# Altium footprint library Cty1.PcbLib: 870 footprints (part 41 of 55)
Each footprint in its own frame and in the unit in brackets; x right, y up, seen from the top. Pads: shape width x height; smd on the part's side, far side on the other; paste and mask are expansions set on the pad; w line width, h text height; cw(c..) or ccw(c..) is an arc to the next point about the centre after c.
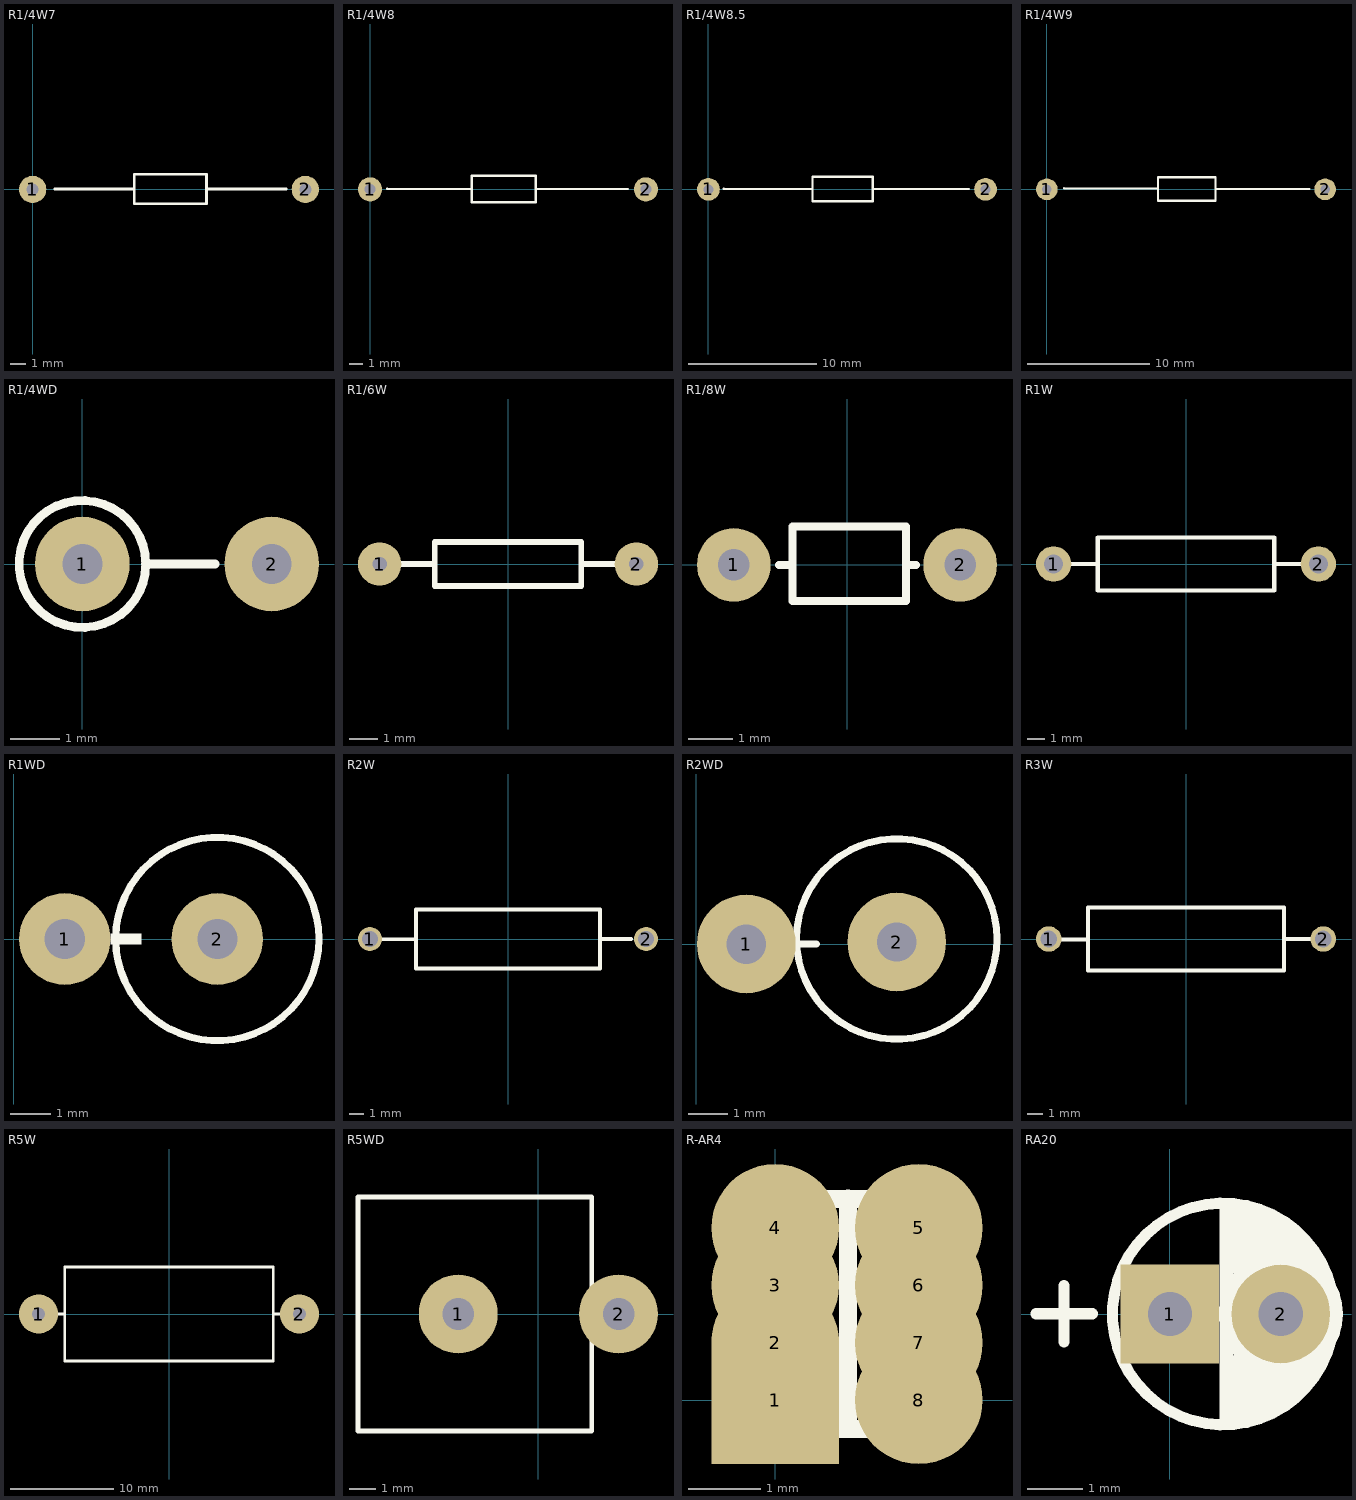
[diagram p40: the footprints below, top view; thin cyan lines are the x and y axes]

## R1/4W7 [mil] "R 1/4W, 2 Pin, 600mil"
height 100
pads (2):
  round 70 hole 31: 1(0,0) 2(700,0)
Top Overlay:
  lines w7: 57,1 261,1 ; 446,1 651,1 ; 261,-37 261,39 446,39 446,-37 261,-37
3D body "SW3dPS-Resistor 5-band.STEP": height 142, standoff -125, extent 4.25,-65 705.75,67

## R1/4W8 [mil] "R 1/4W, 2 Pin, 600mil"
height 100
pads (2):
  round 70 hole 31: 1(0,0) 2(800,0)
Top Overlay:
  lines w7: 50,2 295,1 ; 480,1 748,1 ; 295,-37 480,-37 480,39 295,39 295,-37

## R1/4W8.5 [mil] "R 1/4W, 2 Pin, 600mil"
height 100
pads (2):
  round 70 hole 31: 1(0,0) 2(850,0)
Top Overlay:
  lines w7: 47,2.11 319,1 ; 504,1 799,1 ; 319,-37 504,-37 504,39 319,39 319,-37

## R1/4W9 [mil] "R 1/4W, 2 Pin, 600mil"
height 100
pads (2):
  round 70 hole 31: 1(0,0) 2(900,0)
Top Overlay:
  lines w7: 56.01,3.24 360,2 ; 545,1 849,1 ; 360,-37 360,39 545,39 545,-37 360,-37

## R1/4WD [mm] "R 1/4W, 2 Pin, 150mil"
height 2.54
pads (2):
  round 1.905 hole 0.8: 1(0,0) 2(3.81,0)
Top Overlay:
  circle w0.178: c0,0 r1.276
  lines w0.178: 1.27,0 2.667,0
3D body "SW3DPS-0_5W METAL FILM RESISTOR-DEFAULT.STEP": height 13.42, standoff -4.28, extent -1.778,-1.7 4.322,1.7

## R1/6W [mm]
height 1.524
pads (2):
  round 1.5 hole 0.5: 1(-4.445,0) 2(4.445,0)
Top Overlay:
  lines w0.2: -3.81,0 -2.54,0 ; 3.81,0 2.54,0 ; 2.54,0 2.54,-0.762 -2.54,-0.762 -2.54,0.762 2.54,0.762 2.54,0

## R1/8W [mil] "R 1/8W, 2 pin, 300mil"
height 100
pads (2):
  round 65 hole 28: 1(-100,0) 2(100,0)
Top Overlay:
  lines w7: -60,0 -48,0 ; 54,0 61,0 ; -48,-32 52,-32 52,34 -48,34 -48,-32
3D body "SW3dPS-Res_Normal (0.25W).STEP": height 86.31, standoff -68.11, extent -135,-35.48 135,37

## R1W [mil] "dien tro 1W"
pads (2):
  round 80 hole 43.31: 1(-300,0) 2(300,0)
Top Overlay:
  lines w10: -300,0 -200,0 ; 200,0 300,0 ; -200,-60 200,-60 200,60 -200,60 -200,-60

## R1WD [mil] "R 1W, 2 pin, 500mil"
height 100
pads (2):
  round 90 hole 39.37: 1(50,0) 2(200,0)
Top Overlay:
  circle w7: c200,0 r100
  region: 125,5 125,-5 95,-5 95,5

## R2W [mil] "dien tro 2W"
height 10
pads (2):
  round 65 hole 43.31: 1(-375,0) 2(375,0)
Top Overlay:
  lines w10: -340,-1 -250,-1 -250,-80 250,-80 250,80 -250,80 -250,0 -251,-1 ; 250,0 335,0

## R2WD [mm] "R2W, 2 pin, 700mil"
height 5.08
pads (2):
  round 2.5 hole 1: 1(1.27,0) 2(5.08,0.051)
Top Overlay:
  circle w0.178: c5.08,0.127 r2.54
  lines w0.178: 2.159,0 3.048,0

## R3W [mil] "dien tro 3W"
pads (2):
  round 65 hole 43.31: 1(-350,0) 2(350,0)
Top Overlay:
  lines w10: -321,-1 -250,-1 -250,-80 250,-80 250,80 -250,80 -250,0 -251,-1 ; 250,0 320,0

## R5W [mil] "dien tro 5W"
pads (2):
  round 150 hole 50: 1(-500,0) 2(500,0)
Top Overlay:
  lines w10: -465,0 -400,0 ; 400,0 460,0 ; -400,-180 400,-180 400,180 -400,180 -400,-180

## R5WD [mm] "R5W , 2 pin, 300 x 600 mil"
height 10.16
pads (2):
  round 3 hole 1.2: 1(-3.048,0) 2(3.048,0)
Top Overlay:
  lines w0.178: -6.858,-4.445 -6.858,4.445 2.032,4.445 2.032,-4.445 -6.858,-4.445
3D body "SW3dPS-5W Res.STEP": height 23.05, standoff -2.4, extent -8.648,-5.08 4.432,4.92

## R-AR4 [mil]
pads (8):
  rect 70x70 smd: 1(0,0)
  round 70 smd: 2(0,31.5) 3(0,62.99) 4(0,94.49) 5(78.74,94.49) 6(78.74,62.99) 7(78.74,31.5) 8(78.74,0)
Top Overlay:
  lines w10: 18.49,-15.75 62.99,-15.75 ; 19.68,110.24 59.05,110.24 ; 39.85,-15.39 39.85,110.59

## RA20 [mil]
pads (2):
  rect 70x70 hole 31.5 unplated: 1(0,0)
  round 70 hole 31.5 unplated: 2(78.74,0)
Top Overlay:
  circle w10: c78.74,0 r39.24
  circle w7.87: c37.86,0 r78.74
  lines w7.87: -95.2,0.2 -55.2,0.2 ; -75.2,-19.8 -75.2,20.2
  lines w10: 88.6,-56.4 88.6,-44 ; 95.4,-48.2 95.4,-44 88.6,-44 ; 100,46.4 100,38.6 90.8,38.6 90.8,55.8 85.6,55.8 85.6,44.2 78.2,44.2 78.2,64.6 71,64.6 71,39.4 63,39.4 63,71.8 55,71.8 55,33.2 48,33.2 48,76.4 40.2,76.4 40.2,-73.6 49.2,-73.6 49.2,-32.6 55.6,-32.6 55.6,-70.2 64.4,-70.2 64.4,-41.8 72.4,-41.8 72.4,-64.8 80.4,-64.8 80.4,-44 88.6,-44 ; 101.2,-36.4 101.2,-44 97.2,-44 88.6,-44